# Altium footprint library CONN_FPC.PcbLib: 28 footprints (part 2 of 2)
Each footprint in its own frame and in the unit in brackets; x right, y up, seen from the top. Pads: shape width x height; smd on the part's side, far side on the other; paste and mask are expansions set on the pad; w line width, h text height; cw(c..) or ccw(c..) is an arc to the next point about the centre after c.
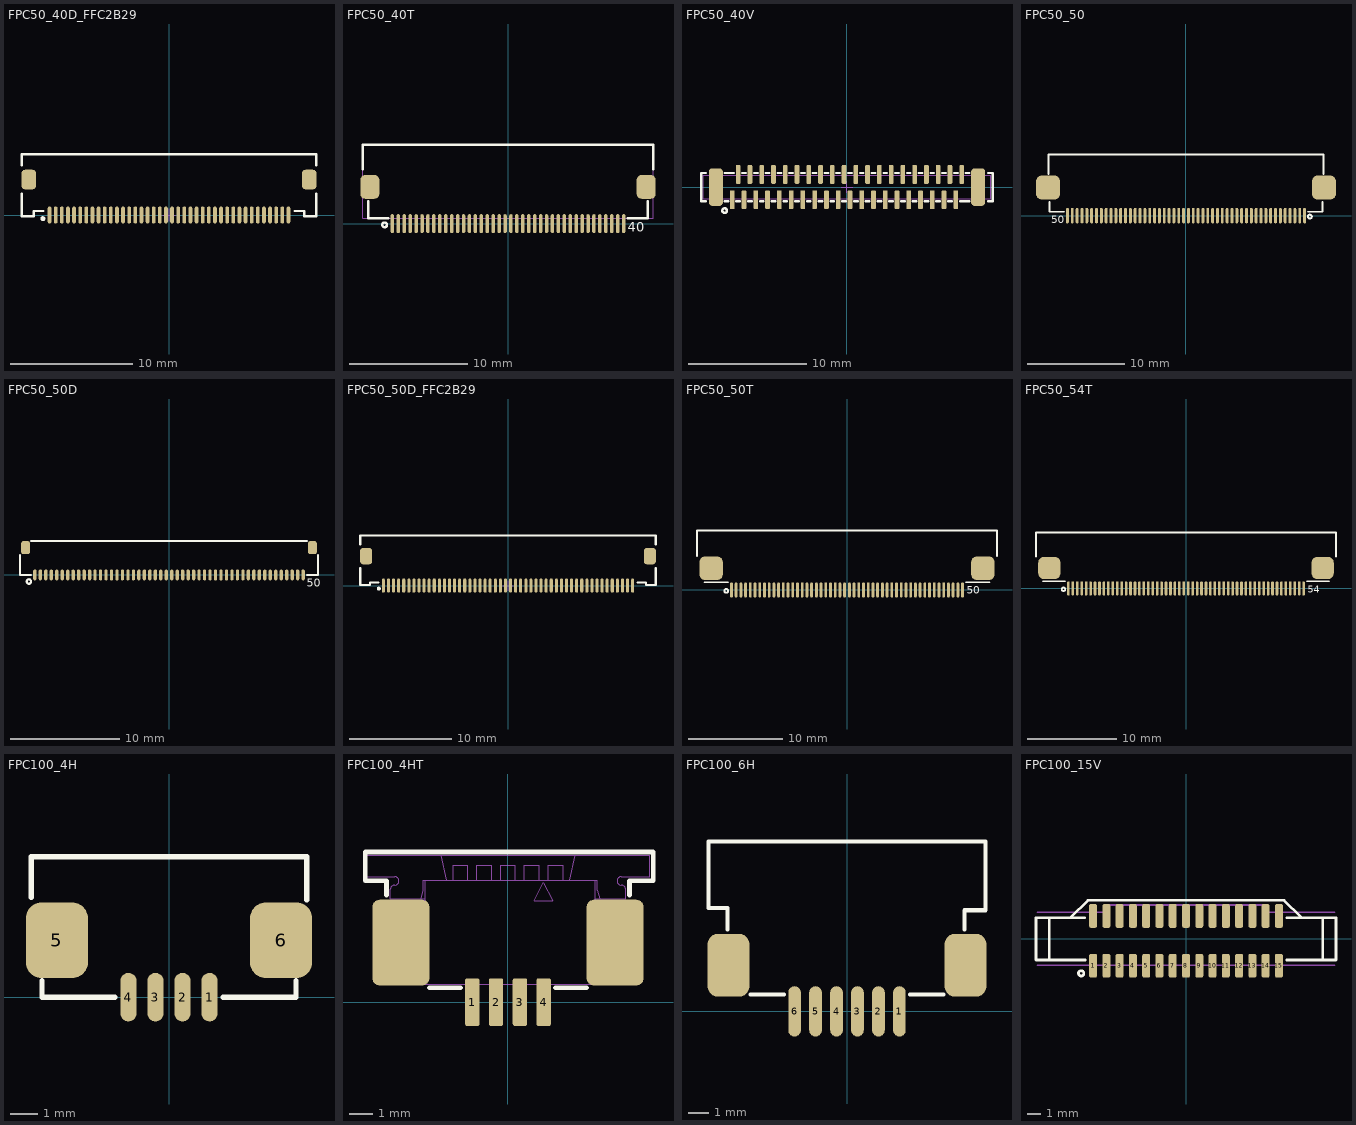
[diagram p1: the footprints below, top view; thin cyan lines are the x and y axes]

## FPC50_40D_FFC2B29 [mm] "FPC, 40 Position; 0.5mm, Top&Bottom Contact, GCT FFC2B29-40-G"
pads (42):
  oval 0.3x1.4 smd mask+0.05: 1(-9.75,0) 2(-9.25,0) 3(-8.75,0) 4(-8.25,0) 5(-7.75,0) 6(-7.25,0) 7(-6.75,0) 8(-6.25,0) 9(-5.75,0) 10(-5.25,0) 11(-4.75,0) 12(-4.25,0) 13(-3.75,0) 14(-3.25,0) 15(-2.75,0) 16(-2.25,0) 17(-1.75,0) 18(-1.25,0) 19(-0.75,0) 20(-0.25,0) 21(0.25,0) 22(0.75,0) 23(1.25,0) 24(1.75,0) 25(2.25,0) 26(2.75,0) 27(3.25,0) 28(3.75,0) 29(4.25,0) 30(4.75,0) 31(5.25,0) 32(5.75,0) 33(6.25,0) 34(6.75,0) 35(7.25,0) 36(7.75,0) 37(8.25,0) 38(8.75,0) 39(9.25,0) 40(9.75,0)
  rrect50% 1.2x1.6 smd: ""(-11.445,2.895) ""(11.445,2.895)
Top Overlay:
  circle w0.2: c-10.3,-0.3 r0.1
  lines w0.2: -12.025,1.745 -12.025,-0.1 -11.055,-0.1 -11.055,0.325 -10.25,0.325 ; -12.025,4.045 -12.025,4.945 12.025,4.945 12.025,4.045 ; 10.25,0.325 11.055,0.325 11.055,-0.1 12.025,-0.1 12.025,1.745
Mechanical 13:
  lines w0.1: -0.5,0 0.5,0 ; 0,-0.5 0,0.5
3D body "FFC2B29-40-G.stp": height 3.66, standoff -0.05, extent -12.025,-0.4 12.025,4.87

## FPC50_40T [mm] "FPC, 40 Position; 0.5mm, Top Contact"
height 2
pads (42):
  oval 0.3x1.6 smd mask+0.05: 1(-9.75,0) 2(-9.25,0) 3(-8.75,0) 4(-8.25,0) 5(-7.75,0) 6(-7.25,0) 7(-6.75,0) 8(-6.25,0) 9(-5.75,0) 10(-5.25,0) 11(-4.75,0) 12(-4.25,0) 13(-3.75,0) 14(-3.25,0) 15(-2.75,0) 16(-2.25,0) 17(-1.75,0) 18(-1.25,0) 19(-0.75,0) 20(-0.25,0) 21(0.25,0) 22(0.75,0) 23(1.25,0) 24(1.75,0) 25(2.25,0) 26(2.75,0) 27(3.25,0) 28(3.75,0) 29(4.25,0) 30(4.75,0) 31(5.25,0) 32(5.75,0) 33(6.25,0) 34(6.75,0) 35(7.25,0) 36(7.75,0) 37(8.25,0) 38(8.75,0) 39(9.25,0) 40(9.75,0)
  rrect50% 1.6x2 smd: ""(-11.65,3.1) ""(11.65,3.1)
Top Overlay:
  circle w0.2: c-10.4,-0.1 r0.2
  lines w0.2: -12.25,4.57 -12.25,6.645 12.25,6.645 12.25,4.57 ; -11.8,1.9 -11.8,0.445 -10.1,0.445 ; 10.1,0.445 11.8,0.445 11.8,1.9
  text "40" at 10.1,-0.7 h0.8
Mechanical 13:
  lines w0.1: -12.25,0.445 -12.25,6.645 12.25,6.645 12.25,0.445 -12.25,0.445
3D body "FH12A-40S-0.5SH.stp": height 2.05, standoff -0.1, extent -12.25,-0.3 12.25,6.7

## FPC50_40V [mm] "FPC, FH12 Series; 40 Position; 0.5mm,Vertical, FH12-40S-0.5SVA"
pads (42):
  rrect50% 0.4x1.6 smd mask+0.1: 1(-9.75,-1.075) 2(-9.25,1.075) 3(-8.75,-1.075) 4(-8.25,1.075) 5(-7.75,-1.075) 6(-7.25,1.075) 7(-6.75,-1.075) 8(-6.25,1.075) 9(-5.75,-1.075) 10(-5.25,1.075) 11(-4.75,-1.075) 12(-4.25,1.075) 13(-3.75,-1.075) 14(-3.25,1.075) 15(-2.75,-1.075) 16(-2.25,1.075) 17(-1.75,-1.075) 18(-1.25,1.075) 19(-0.75,-1.075) 20(-0.25,1.075) 21(0.25,-1.075) 22(0.75,1.075) 23(1.25,-1.075) 24(1.75,1.075) 25(2.25,-1.075) 26(2.75,1.075) 27(3.25,-1.075) 28(3.75,1.075) 29(4.25,-1.075) 30(4.75,1.075) 31(5.25,-1.075) 32(5.75,1.075) 33(6.25,-1.075) 34(6.75,1.075) 35(7.25,-1.075) 36(7.75,1.075) 37(8.25,-1.075) 38(8.75,1.075) 39(9.25,-1.075) 40(9.75,1.075)
  rrect50% 1.2x3.2 smd: ""(-11.15,0) ""(11.15,0)
Top Overlay:
  circle w0.2: c-10.4,-2 r0.2
  lines w0.2: -12,-1.2 -12.4,-1.2 -12.4,1.2 -12,1.2 ; -10.4,-1.2 -10.1,-1.2 ; -10.4,1.2 -9.6,1.2 ; -9.4,-1.2 -9.1,-1.2 ; -8.9,1.2 -8.6,1.2 ; -8.4,-1.2 -8.1,-1.2 ; -7.9,1.2 -7.6,1.2 ; -7.4,-1.2 -7.1,-1.2 ; -6.9,1.2 -6.6,1.2 ; -6.4,-1.2 -6.1,-1.2 ; -5.9,1.2 -5.6,1.2 ; -5.4,-1.2 -5.1,-1.2 ; -4.9,1.2 -4.6,1.2 ; -4.4,-1.2 -4.1,-1.2 ; -3.9,1.2 -3.6,1.2 ; -3.4,-1.2 -3.1,-1.2 ; -2.9,1.2 -2.6,1.2 ; -2.4,-1.2 -2.1,-1.2 ; -1.9,1.2 -1.6,1.2 ; -1.4,-1.2 -1.1,-1.2 ; -0.9,1.2 -0.6,1.2 ; -0.4,-1.2 -0.1,-1.2 ; 0.1,1.2 0.4,1.2 ; 0.6,-1.2 0.9,-1.2 ; 1.1,1.2 1.4,1.2 ; 1.6,-1.2 1.9,-1.2 ; 2.1,1.2 2.4,1.2 ; 2.6,-1.2 2.9,-1.2 ; 3.1,1.2 3.4,1.2 ; 3.6,-1.2 3.9,-1.2 ; 4.1,1.2 4.4,1.2 ; 4.6,-1.2 4.9,-1.2 ; 5.1,1.2 5.4,1.2 ; 5.6,-1.2 5.9,-1.2 ; 6.1,1.2 6.4,1.2 ; 6.6,-1.2 6.9,-1.2 ; 7.1,1.2 7.4,1.2 ; 7.6,-1.2 7.9,-1.2 ; 8.1,1.2 8.4,1.2 ; 8.6,-1.2 8.9,-1.2 ; 9.1,1.2 9.4,1.2 ; 9.6,-1.2 10.4,-1.2 ; 10.1,1.2 10.4,1.2 ; 12,-1.2 12.4,-1.2 12.4,1.2 12,1.2
Mechanical 13:
  lines w0.1: -12.2,-1 -12.2,1 12.2,1 12.2,-1 -12.2,-1
Mechanical 15:
  lines w0.1: -0.5,0 0.5,0 ; 0,-0.5 0,0.5
3D body "ZIF connector.stp": height 4.47, standoff -0.02, extent -12.118,-1.454 12.182,1.483

## FPC50_50 [mm] "FPC, pitch: 0.5mm, FH12-50S-0.5SH"
height 3
pads (52):
  oval 0.3x1.6 smd mask+0.05: 1(12.25,0) 2(11.75,0) 3(11.25,0) 4(10.75,0) 5(10.25,0) 6(9.75,0) 7(9.25,0) 8(8.75,0) 9(8.25,0) 10(7.75,0) 11(7.25,0) 12(6.75,0) 13(6.25,0) 14(5.75,0) 15(5.25,0) 16(4.75,0) 17(4.25,0) 18(3.75,0) 19(3.25,0) 20(2.75,0) 21(2.25,0) 22(1.75,0) 23(1.25,0) 24(0.75,0) 25(0.25,0) 26(-0.25,0) 27(-0.75,0) 28(-1.25,0) 29(-1.75,0) 30(-2.25,0) 31(-2.75,0) 32(-3.25,0) 33(-3.75,0) 34(-4.25,0) 35(-4.75,0) 36(-5.25,0) 37(-5.75,0) 38(-6.25,0) 39(-6.75,0) 40(-7.25,0) 41(-7.75,0) 42(-8.25,0) 43(-8.75,0) 44(-9.25,0) 45(-9.75,0) 46(-10.25,0) 47(-10.75,0) 48(-11.25,0) 49(-11.75,0) 50(-12.25,0)
  rrect50% 2.5x2.5 smd: ""(-14.25,2.9) ""(14.25,2.9)
Top Overlay:
  circle w0.2: c12.8,-0.1 r0.2
  lines w0.2: -14.2,4.3 -14.2,6.3 14.2,6.3 14.2,4.3 ; -14.1,1.4 -14.1,0.4 -12.6,0.4 ; 12.6,0.4 14.1,0.4 14.1,1.4
  text "50" at -13.9,-0.8 h0.8
3D body "FH12-50S-0.5SH.stp": height 2.09, standoff -0.01, extent -14.55,-0.3 14.55,6.1

## FPC50_50D [mm] "FPC, pitch: 0.5mm, Top&Bottom Contact, FH34SRJ-50S-0.5SH"
height 3
pads (52):
  oval 0.3x1 smd paste-0.025 mask+0.05: 1(-12.25,0) 2(-11.75,0) 3(-11.25,0) 4(-10.75,0) 5(-10.25,0) 6(-9.75,0) 7(-9.25,0) 8(-8.75,0) 9(-8.25,0) 10(-7.75,0) 11(-7.25,0) 12(-6.75,0) 13(-6.25,0) 14(-5.75,0) 15(-5.25,0) 16(-4.75,0) 17(-4.25,0) 18(-3.75,0) 19(-3.25,0) 20(-2.75,0) 21(-2.25,0) 22(-1.75,0) 23(-1.25,0) 24(-0.75,0) 25(-0.25,0) 26(0.25,0) 27(0.75,0) 28(1.25,0) 29(1.75,0) 30(2.25,0) 31(2.75,0) 32(3.25,0) 33(3.75,0) 34(4.25,0) 35(4.75,0) 36(5.25,0) 37(5.75,0) 38(6.25,0) 39(6.75,0) 40(7.25,0) 41(7.75,0) 42(8.25,0) 43(8.75,0) 44(9.25,0) 45(9.75,0) 46(10.25,0) 47(10.75,0) 48(11.25,0) 49(11.75,0) 50(12.25,0)
  rrect50% 0.8x1.2 smd paste-0.05 mask+0.05: ""(-13.1,2.5) ""(13.1,2.5)
Top Overlay:
  circle w0.2: c-12.8,-0.6 r0.2
  lines w0.2: -13.6,1.8 -13.6,0 -12.6,0 ; -12.6,3.1 12.6,3.1 ; 12.6,0 13.6,0 13.6,1.8
  text "50" at 12.6,-1.1 h0.75
3D body "FH34SRJ-50S-0.5SH.stp": height 1, standoff 0, extent -13.5,-0.8 13.5,3

## FPC50_50D_FFC2B29 [mm] "FPC, 40 Position; 0.5mm, Top&Bottom Contact, GCT FFC2B29-50-G"
pads (52):
  oval 0.3x1.4 smd mask+0.05: 1(-12.25,0) 2(-11.75,0) 3(-11.25,0) 4(-10.75,0) 5(-10.25,0) 6(-9.75,0) 7(-9.25,0) 8(-8.75,0) 9(-8.25,0) 10(-7.75,0) 11(-7.25,0) 12(-6.75,0) 13(-6.25,0) 14(-5.75,0) 15(-5.25,0) 16(-4.75,0) 17(-4.25,0) 18(-3.75,0) 19(-3.25,0) 20(-2.75,0) 21(-2.25,0) 22(-1.75,0) 23(-1.25,0) 24(-0.75,0) 25(-0.25,0) 26(0.25,0) 27(0.75,0) 28(1.25,0) 29(1.75,0) 30(2.25,0) 31(2.75,0) 32(3.25,0) 33(3.75,0) 34(4.25,0) 35(4.75,0) 36(5.25,0) 37(5.75,0) 38(6.25,0) 39(6.75,0) 40(7.25,0) 41(7.75,0) 42(8.25,0) 43(8.75,0) 44(9.25,0) 45(9.75,0) 46(10.25,0) 47(10.75,0) 48(11.25,0) 49(11.75,0) 50(12.25,0)
  rrect50% 1.2x1.6 smd: ""(-13.945,2.895) ""(13.945,2.895)
Top Overlay:
  circle w0.2: c-12.7,-0.3 r0.1
  lines w0.2: -14.525,1.745 -14.525,0.045 -13.555,0.045 -13.555,0.325 -12.75,0.325 ; -14.525,4.045 -14.525,4.945 14.525,4.945 14.525,4.045 ; 12.75,0.325 13.555,0.325 13.555,0.045 14.525,0.045 14.525,1.745
Mechanical 13:
  lines w0.1: -0.5,0 0.5,0 ; 0,-0.5 0,0.5
3D body "FFC2B29-50-G.stp": height 3.66, standoff -0.05, extent -14.525,-0.4 14.525,4.87

## FPC50_50T [mm] "FPC, pitch: 0.5mm, FFC2B17-50-T"
height 3
pads (52):
  oval 0.3x1.6 smd mask+0.05: 1(-12.25,0) 2(-11.75,0) 3(-11.25,0) 4(-10.75,0) 5(-10.25,0) 6(-9.75,0) 7(-9.25,0) 8(-8.75,0) 9(-8.25,0) 10(-7.75,0) 11(-7.25,0) 12(-6.75,0) 13(-6.25,0) 14(-5.75,0) 15(-5.25,0) 16(-4.75,0) 17(-4.25,0) 18(-3.75,0) 19(-3.25,0) 20(-2.75,0) 21(-2.25,0) 22(-1.75,0) 23(-1.25,0) 24(-0.75,0) 25(-0.25,0) 26(0.25,0) 27(0.75,0) 28(1.25,0) 29(1.75,0) 30(2.25,0) 31(2.75,0) 32(3.25,0) 33(3.75,0) 34(4.25,0) 35(4.75,0) 36(5.25,0) 37(5.75,0) 38(6.25,0) 39(6.75,0) 40(7.25,0) 41(7.75,0) 42(8.25,0) 43(8.75,0) 44(9.25,0) 45(9.75,0) 46(10.25,0) 47(10.75,0) 48(11.25,0) 49(11.75,0) 50(12.25,0)
  rrect50% 2.5x2.5 smd: ""(-14.4,2.3) ""(14.4,2.3)
Top Overlay:
  circle w0.2: c-12.8,-0.1 r0.2
  lines w0.2: -15.9,3.6 -15.9,6.3 15.9,6.3 15.9,3.6 ; -15.1,0.816 -12.6,0.816 ; 12.6,0.816 15.1,0.816
  text "50" at 12.7,-0.4 h0.8
3D body "FFC2B17-50-X_revA3.STEP": height 2.46, standoff -0.05, extent -15.75,-0.5 15.75,6.25

## FPC50_54T [mm] "FPC, pitch: 0.5mm, FFC2B17-54-T"
height 3
pads (56):
  oval 0.3x1.6 smd mask+0.05: 1(-13.25,0) 2(-12.75,0) 3(-12.25,0) 4(-11.75,0) 5(-11.25,0) 6(-10.75,0) 7(-10.25,0) 8(-9.75,0) 9(-9.25,0) 10(-8.75,0) 11(-8.25,0) 12(-7.75,0) 13(-7.25,0) 14(-6.75,0) 15(-6.25,0) 16(-5.75,0) 17(-5.25,0) 18(-4.75,0) 19(-4.25,0) 20(-3.75,0) 21(-3.25,0) 22(-2.75,0) 23(-2.25,0) 24(-1.75,0) 25(-1.25,0) 26(-0.75,0) 27(-0.25,0) 28(0.25,0) 29(0.75,0) 30(1.25,0) 31(1.75,0) 32(2.25,0) 33(2.75,0) 34(3.25,0) 35(3.75,0) 36(4.25,0) 37(4.75,0) 38(5.25,0) 39(5.75,0) 40(6.25,0) 41(6.75,0) 42(7.25,0) 43(7.75,0) 44(8.25,0) 45(8.75,0) 46(9.25,0) 47(9.75,0) 48(10.25,0) 49(10.75,0) 50(11.25,0) 51(11.75,0) 52(12.25,0) 53(12.75,0) 54(13.25,0)
  rrect50% 2.5x2.5 smd: ""(-15.4,2.3) ""(15.4,2.3)
Top Overlay:
  circle w0.2: c-13.8,-0.1 r0.2
  lines w0.2: -16.9,3.6 -16.9,6.3 16.9,6.3 16.9,3.6 ; -16.1,0.816 -13.6,0.816 ; 13.6,0.816 16.1,0.816
  text "54" at 13.7,-0.5 h0.8
3D body "FFC2B17-54-X_revA3.STEP": height 2.46, standoff -0.05, extent -16.75,-0.5 16.75,6.25

## FPC100_4H [mm] "FPC, 1mm, Horizental, Bot. Contact, Molex 200529-0040"
height 0.8
pads (6):
  oval 0.6x1.8 smd: 1(1.5,0) 2(0.5,0) 3(-0.5,0) 4(-1.5,0)
  rrect50% 2.3x2.8 smd: 5(-4.15,2.1) 6(4.15,2.1)
Top Overlay:
  lines w0.2: -5.1,3.7 -5.1,5.2 5.1,5.2 5.1,3.6 ; -4.7,0.6 -4.7,0 -2,0 ; 2,0 4.7,0 4.7,0.6
3D body "2005290040.stp": height 1.93, standoff -0.03, extent -5,-0.25 5,5.05

## FPC100_4HT [mm] "TE Connectivity 4-pin ZIF connector TE84953-4"
height 2.74
pads (6):
  rrect25% 0.6x2 smd: 1(-1.5,0) 2(-0.5,0) 3(0.5,0) 4(1.5,0)
  rrect25% 2.4x3.6 smd: ""(-4.5,2.5) ""(4.5,2.5)
Top Overlay:
  lines w0.2: -5.1,4.5 -5.1,5.1 -6,5.1 -6,6.3 6.1,6.3 6.1,5.1 5.1,5.1 5.1,4.5 ; -3.3,0.6 -2,0.6 ; 2,0.6 3.3,0.6
Mechanical 13:
  lines w0.05: -4.56,0.75 -4.56,4.25 -3.47,4.25 -3.47,5.12 ; -4.56,3.2 -4.18,3.2 ; -4.28,4.25 -4.18,3.877 -4.18,2.98 -3.93,2.98 ; -4.229,4.25 -4.232,4.26 -5.072,4.26 ccw(c-5.072,4.16) -5.172,4.16 -5.172,3.859 ccw(c-5.072,3.859) -5.072,3.759 -4.762,3.759 cw(c-4.762,3.659) -4.662,3.659 -4.662,3.357 cw(c-4.762,3.357) -4.762,3.257 -5.072,3.257 ccw(c-5.072,3.157) -5.172,3.157 -5.172,2.856 ccw(c-5.072,2.856) -5.072,2.756 -4.762,2.756 cw(c-4.762,2.656) -4.662,2.656 -4.662,2.355 cw(c-4.762,2.355) -4.762,2.255 -5.072,2.255 ccw(c-5.072,2.155) -5.172,2.155 -5.172,1.853 ccw(c-5.072,1.853) -5.072,1.753 -4.762,1.753 cw(c-4.762,1.653) -4.662,1.653 -4.662,1.352 cw(c-4.762,1.352) -4.762,1.252 -5.072,1.252 ccw(c-5.072,1.152) -5.172,1.152 -5.172,0.85 ccw(c-5.072,0.85) -5.072,0.75 5.072,0.75 ccw(c5.072,0.85) 5.172,0.85 5.172,1.152 ccw(c5.072,1.152) 5.072,1.252 4.762,1.252 cw(c4.762,1.352) 4.662,1.352 4.662,1.653 cw(c4.762,1.653) 4.762,1.753 5.072,1.753 ccw(c5.072,1.853) 5.172,1.853 5.172,2.155 ccw(c5.072,2.155) 5.072,2.255 4.762,2.255 cw(c4.762,2.355) 4.662,2.355 4.662,2.656 cw(c4.762,2.656) 4.762,2.756 5.072,2.756 ccw(c5.072,2.856) 5.172,2.856 5.172,3.157 ccw(c5.072,3.157) 5.072,3.257 4.762,3.257 cw(c4.762,3.357) 4.662,3.357 4.662,3.659 cw(c4.762,3.659) 4.762,3.759 5.072,3.759 ccw(c5.072,3.859) 5.172,3.859 5.172,4.16 ccw(c5.072,4.16) 5.072,4.26 3.982,4.26 3.982,4.25 ; -3.93,0.75 -3.93,3.877 -3.83,4.25 ; -3.646,4.33 -3.55,4.69 -3.55,5.12 3.75,5.12 3.75,4.69 3.847,4.33 ; -3.47,4.33 -4.94,4.33 -4.94,4.73 cw(c-4.76,4.73) -4.76,4.91 ccw(c-4.76,5.09) -4.76,5.27 -5.96,5.27 -5.96,6.16 5.96,6.16 5.96,5.27 4.76,5.27 ccw(c4.76,5.09) 4.76,4.91 cw(c4.76,4.73) 4.94,4.73 4.94,4.33 3.67,4.33 ; -2.82,6.16 -2.59,5.12 ; -2.309,5.12 -2.309,5.75 -1.689,5.75 -1.689,5.12 ; -1.604,-0.26 -1.404,-0.26 ; -1.604,0.11 -1.404,0.11 ; -1.604,0.24 -1.404,0.24 ; -1.604,0.75 -1.604,-0.39 -1.404,-0.39 -1.404,0.75 ; -1.309,5.12 -1.309,5.75 -0.689,5.75 -0.689,5.12 ; -0.604,-0.26 -0.404,-0.26 ; -0.604,0.11 -0.404,0.11 ; -0.604,0.24 -0.404,0.24 ; -0.604,0.75 -0.604,-0.39 -0.404,-0.39 -0.404,0.75 ; -0.309,5.12 -0.309,5.75 0.311,5.75 0.311,5.12 ; 0.396,-0.26 0.596,-0.26 ; 0.396,0.11 0.596,0.11 ; 0.396,0.24 0.596,0.24 ; 0.396,0.75 0.396,-0.39 0.596,-0.39 0.596,0.75 ; 0.691,5.12 0.691,5.75 1.311,5.75 1.311,5.12 ; 1.396,-0.26 1.596,-0.26 ; 1.396,0.11 1.596,0.11 ; 1.396,0.24 1.596,0.24 ; 1.396,0.75 1.396,-0.39 1.596,-0.39 1.596,0.75 ; 1.691,5.12 1.691,5.75 2.311,5.75 2.311,5.12 ; 2.59,5.12 2.82,6.16 ; 3.67,5.12 3.67,4.25 4.56,4.25 4.56,0.75 ; 3.83,0.75 3.93,1.123 3.93,4.25 ; 3.93,2.02 4.56,2.02 ; 4.18,2.02 4.18,1.123 4.28,0.75 ; 4.18,4.25 4.18,4.26 ; 1.111,4.25 1.871,4.25 1.491,5.01 1.111,4.25
3D body "ZIF Conn TE 84953-4.STEP": height 2.58, standoff 0, extent -5.96,-0.39 5.96,6.16

## FPC100_6H [mm] "FPC 6pin pitch: 1.0mm, Molex 52271-0679"
height 3
pads (8):
  oval 0.6x2.4 smd: 1(2.5,0) 2(1.5,0) 3(0.5,0) 4(-0.5,0) 5(-1.5,0) 6(-2.5,0)
  rrect50% 2x3 smd: ""(-5.65,2.2) ""(5.65,2.2)
Top Overlay:
  lines w0.2: -5.7,3.9 -5.7,4.925 -6.6,4.925 -6.6,8.1 6.6,8.1 6.6,4.825 5.6,4.825 5.6,3.9 ; -4.6,0.8 -3,0.8 ; 3,0.8 4.6,0.8
3D body "522710679.stp": height 3, standoff 0, extent -6.5,-0.7 6.5,8

## FPC100_15V [mm] "TE 1-1734248-5"
height 2.3
pads (30):
  rrect50% 0.6x1.8 smd: 1(-7,-2.025) 2(-6,-2.025) 3(-5,-2.025) 4(-4,-2.025) 5(-3,-2.025) 6(-2,-2.025) 7(-1,-2.025) 8(0,-2.025) 9(1,-2.025) 10(2,-2.025) 11(3,-2.025) 12(4,-2.025) 13(5,-2.025) 14(6,-2.025) 15(7,-2.025) ""(-7,1.725) ""(-6,1.725) ""(-5,1.725) ""(-4,1.725) ""(-3,1.725) ""(-2,1.725) ""(-1,1.725) ""(0,1.725) ""(1,1.725) ""(2,1.725) ""(3,1.725) ""(4,1.725) ""(5,1.725) ""(6,1.725) ""(7,1.725)
Top Overlay:
  circle w0.2: c-7.9,-2.6 r0.2
  lines w0.2: -10.3,-1.6 -10.3,1.6 ; -8.65,1.65 -7.4,2.9 7.4,2.9 8.65,1.65 ; -7.65,1.6 -11.3,1.6 -11.3,-1.6 -7.6,-1.6 ; 7.6,-1.6 11.3,-1.6 11.3,1.6 7.6,1.6 ; 10.3,-1.6 10.3,1.6
Mechanical 4:
  lines w0.127: -6,2 -6,2.55 ; -6,2 -11.2,2 -6,2 ; -6,2 -6,2.55 ; -6,2.55 6,2.55 ; -6,2.55 6,2.55 ; 6,2 6,2.55 ; 6,2 11.2,2 6,2 ; 6,2 6,2.55 ; -11.2,-2 11.2,-2 -11.2,-2
3D body "1-1734248-5.stp": height 5.63, standoff -0.06, extent -11.2,-2.4 11.2,2.45